# Altium footprint library Relay.PcbLib: 60 footprints (part 1 of 4)
Each footprint in its own frame and in the unit in brackets; x right, y up, seen from the top. Pads: shape width x height; smd on the part's side, far side on the other; paste and mask are expansions set on the pad; w line width, h text height; cw(c..) or ccw(c..) is an arc to the next point about the centre after c.
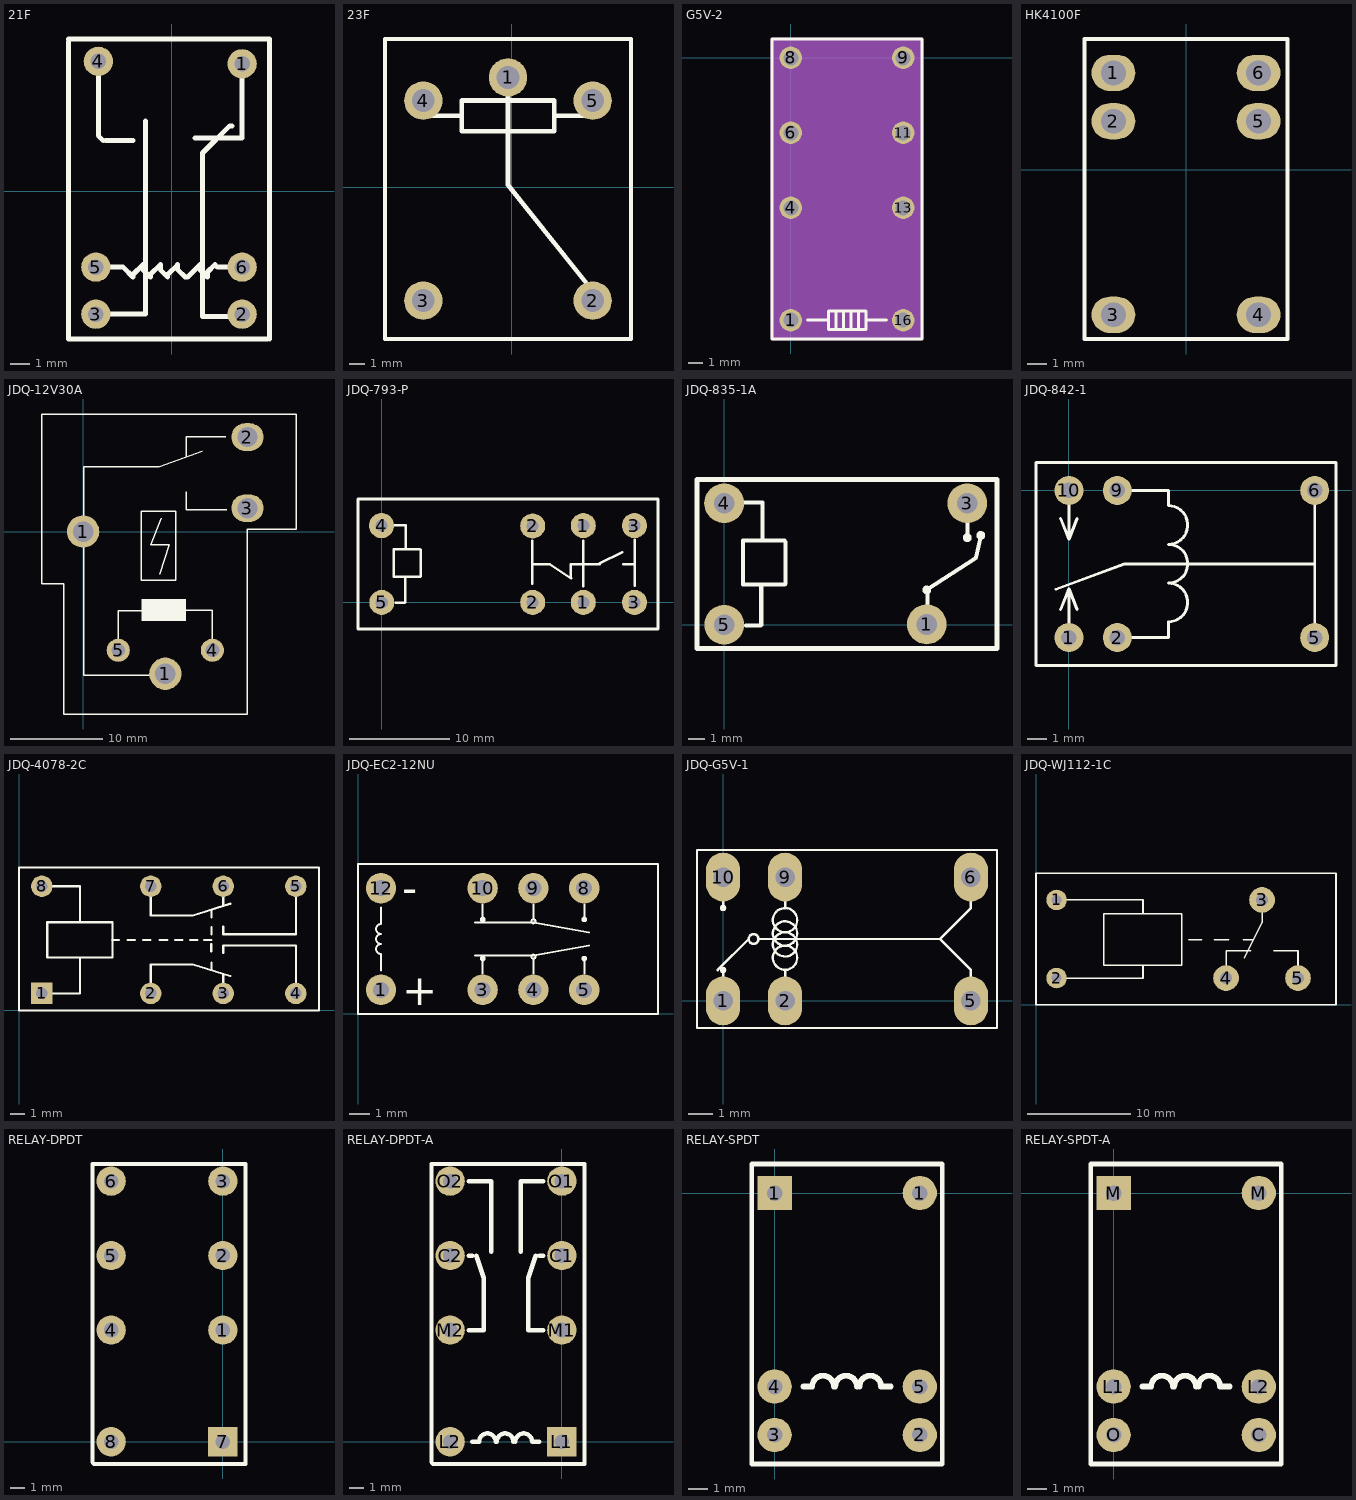
[diagram p0: the footprints below, top view; thin cyan lines are the x and y axes]

## 21F [mm]
pads (6):
  round 1.5 hole 0.8: 1(3.61,6.526) 2(3.61,-6.301) 3(-3.883,-6.301) 4(-3.756,6.653) 5(-3.883,-3.888) 6(3.61,-3.888)
Top Overlay:
  lines w0.254: -5.28,7.669 -5.28,-7.317 -5.28,-7.571 -5.026,-7.571 ; -5.28,7.796 5.007,7.796 5.007,-7.571 ; -5.153,-7.571 4.88,-7.571 ; -3.883,-6.301 -1.343,-6.301 -1.343,3.605 ; -3.883,-3.888 -2.486,-3.888 -1.978,-4.396 -1.978,-4.269 -1.47,-3.761 -1.47,-4.015 -1.089,-4.396 -1.089,-4.269 -0.581,-3.761 -0.581,-4.015 -0.2,-4.396 -0.2,-4.269 0.308,-3.761 0.308,-4.015 0.689,-4.396 0.816,-4.396 1.451,-3.761 1.451,-4.015 1.832,-4.396 1.832,-4.142 2.213,-3.761 2.34,-3.888 3.356,-3.888 ; -3.756,6.653 -3.756,2.843 -3.502,2.589 ; -3.375,2.589 -1.978,2.589 ; 1.197,2.716 3.61,2.716 3.61,6.526 ; 3.102,3.351 2.975,3.351 1.578,1.954 1.578,1.192 1.578,-6.428 3.737,-6.428

## 23F [mil]
pads (5):
  round 100 hole 59.06: 1(-10,285) 2(210,-295) 3(-230,-295) 4(-230,225) 5(210,225)
Top Overlay:
  lines w10: -330,-395 310,-395 310,385 -330,385 -330,-395
  lines w12: -250,185 -130,185 ; -230,185 -230,225 ; -10,285 -10,5 230,-295 ; 110,185 230,185 ; 210,185 210,225 ; -130,145 110,145 110,225 -130,225 -130,145

## G5V-2 [mil]
pads (8):
  round 60 hole 40: 1(0,-700) 4(0,-400) 6(0,-200) 8(0,0) 9(300,0) 11(300,-200) 13(300,-400) 16(300,-700)
Top Overlay:
  lines w8: 45,-700 100,-700 ; 120,-725 120,-675 ; 140,-725 140,-675 ; 160,-725 160,-675 ; 180,-725 180,-675 ; 200,-700 255,-700 ; -50,-750 -50,50 350,50 350,-750 -50,-750 ; 100,-725 100,-675 200,-675 200,-725 100,-725
Mechanical 6:
  text "13" at 260,-450 h25
  text "11" at 260,-250 h25
  text "6" at -20,-250 h25
  text "9" at 280,-50 h25
  text "16" at 260,-750 h25
  text "8" at -20,-50 h25
  text "1" at -20,-750 h25
  text "4" at -20,-450 h25
Mechanical 7:
  lines w8: 45,-700 100,-700 ; 120,-725 120,-675 ; 140,-725 140,-675 ; 160,-725 160,-675 ; 180,-725 180,-675 ; 200,-700 255,-700 ; -50,-750 -50,50 350,50 350,-750 -50,-750 ; 100,-725 100,-675 200,-675 200,-725 100,-725
  text ".Designator" at -60,-680 h25
Mechanical 8:
  region: 350,-750 350,50 -50,50 -50,-750

## HK4100F [mm] "继?"
height 11.8
pads (6):
  oval 2.3x1.9 hole 1.3: 1(-3.81,5.08) 2(-3.81,2.54) 3(-3.81,-7.62) 4(3.81,-7.62) 5(3.81,2.54) 6(3.81,5.08)
Top Overlay:
  lines w0.2: -5.334,-8.89 5.334,-8.89 5.334,6.858 -5.334,6.858 -5.334,-8.89
3D body: height 12, standoff 0, extent -5.334,-8.89 5.334,6.858

## JDQ-12V30A [mm]
pads (6):
  round 3.5 hole 2.2: 1(0,0) 1(8.9,-15.4)
  oval 3.5x3 hole 2.2: 2(17.8,10.24) 3(17.8,2.54)
  round 2.5 hole 1.5: 4(14,-12.86) 5(3.8,-12.86)
Top Overlay:
  region: 11.147,-9.677 11.147,-7.315 6.296,-7.315 6.296,-9.677
  lines w0.15: 3.779,-12.979 3.779,-8.585 6.903,-8.585 ; 8.275,-4.623 9.342,-1.448 7.335,-1.448 8.453,1.473 ; 8.935,-15.545 0.045,-15.545 0.045,7.036 8.224,7.036 12.923,8.687 ; 10.282,-8.509 13.965,-8.509 13.965,-12.522 ; 11.145,4.318 11.145,2.388 15.565,2.388 ; 11.145,8.153 11.145,10.287 15.463,10.287 ; -4.5,-5.66 -4.5,12.74 23.1,12.74 23.1,0.24 17.8,0.24 17.8,-19.76 -2.1,-19.76 -2.1,-5.66 -4.499,-5.66 ; 6.294,-5.258 6.294,2.184 10.053,2.184 10.053,-5.258 6.294,-5.258
3D body "User Library-RELAY-RT1-24-30-A.step": height 20.2, standoff -2.8, extent -4.2,-19.51 22.8,12.49

## JDQ-793-P [mil]
pads (8):
  round 98 hole 47.24: 1(788,0) 1(788,300) 2(590,0) 2(590,299) 3(988,0) 3(988,300) 5(0,0)
  round 98.43 hole 47.24: 4(-0.98,300)
Top Overlay:
  lines w10: 43.31,302.17 94.49,302.17 94.49,210.63 ; 54.13,-1.97 89.57,-1.97 ; 91.54,0 91.54,99.41 ; 588.58,72.83 588.58,240.16 ; 588.58,149.61 653.54,149.61 ; 657.48,149.61 653.54,149.61 ; 738.19,95.47 738.19,149.61 786.42,149.61 ; 740.16,93.5 654.53,149.61 653.54,149.61 ; 788.39,62.99 788.39,241.14 ; 788.39,149.61 852.36,149.61 852.36,152.56 940.95,195.87 ; 944.88,149.61 989.17,149.61 ; 989.17,64.96 989.17,244.09 ; 46.26,99.41 149.61,99.41 151.57,101.38 151.57,204.72 148.62,207.68 46.26,207.68 46.26,99.41
  lines w12: -93,-104 1080,-104 1080,404 -93,404 -93,-104
3D body "User Library-LM1H.step": height 822.83, standoff -157.09, extent -87.21,-96.06 1074.21,396.06

## JDQ-835-1A [mil]
pads (4):
  round 98 hole 51.18: 1(500,1) 3(600,300) 5(0,0)
  round 98.43 hole 51.18: 4(0,300)
Top Overlay:
  circle w5.91: c500,85.93 r7.87
  circle w5.91: c600,215.07 r7.87
  circle w5.91: c633.25,220.4 r7.87
  lines w10: 43.31,302.17 94.49,302.17 94.49,210.63 ; 54.13,-1.97 89.57,-1.97 ; 91.54,0 91.54,99.41 ; 500,85.93 621.88,165.78 633.25,220.4 ; 501.57,1 501.57,85.93 ; 600,215.07 600,300 ; 46.26,99.41 149.61,99.41 151.57,101.38 151.57,204.72 148.62,207.68 46.26,207.68 46.26,99.41
  lines w12: -66.93,-58.66 673.23,-58.66 673.23,358.66 -66.93,358.66 -66.93,-58.66
3D body "User Library-TRC.step": height 590.55, standoff -137.8, extent -55.12,-50.98 661.42,350.98

## JDQ-842-1 [mm]
pads (6):
  round 1.5 hole 0.8 unplated: 1(0,-7.6)
  round 1.5 hole 0.8: 2(2.5,-7.6) 5(12.7,-7.6) 6(12.7,0) 9(2.5,0) 10(0,0)
Top Overlay:
  lines w0.15: -0.663,-5.103 2.853,-3.8 12.7,-3.8 ; -0.424,-6.145 0,-5.078 ; -0.424,-1.455 0,-2.522 ; 0,-7.6 0,-5.078 ; 0,0 0,-2.522 ; 0.424,-6.145 0,-5.078 ; 0.424,-1.455 0,-2.522 ; 2.5,-7.6 5.139,-7.6 5.139,-6.785 ccw(c5.139,-5.785) 5.139,-4.785 ccw(c5.139,-3.785) 5.139,-2.785 ccw(c5.139,-1.785) 5.139,-0.785 5.139,0 2.5,0 ; 12.7,-7.6 12.7,0 ; -1.7,-9.05 13.8,-9.05 13.8,1.45 -1.7,1.45 -1.7,-9.05
3D body "User Library-TRB.step": height 11.81, standoff -3.5, extent -1.7,-9.15 13.8,1.55

## JDQ-4078-2C [mm]
pads (8):
  rect 1.5x1.5 hole 0.8: 1(1.6,1.19)
  round 1.5 hole 0.8: 2(9.22,1.19) 3(14.3,1.19) 4(19.38,1.19) 5(19.38,8.69) 6(14.3,8.69) 7(9.22,8.69) 8(1.6,8.69)
Top Overlay:
  lines w0.15: 1.6,1.19 4.267,1.19 4.267,3.708 ; 1.6,8.69 4.267,8.69 4.267,6.172 ; 6.528,4.928 7,4.928 ; 7.595,4.928 8.121,4.928 ; 8.687,4.928 9.213,4.928 ; 9.22,1.19 9.22,3.226 12.192,3.226 14.783,2.413 ; 9.22,8.69 9.22,6.654 12.192,6.654 14.783,7.467 ; 9.855,4.928 10.382,4.928 ; 10.922,4.928 11.448,4.928 ; 11.963,4.928 12.49,4.928 ; 12.954,4.928 13.48,4.928 ; 13.462,4.122 13.462,4.648 ; 13.487,2.819 13.487,3.346 ; 13.487,5.316 13.487,5.842 ; 13.487,6.509 13.487,7.036 ; 14.3,1.19 14.3,2.515 ; 14.3,4.013 14.3,4.547 19.38,4.547 19.38,1.19 ; 14.3,5.867 14.3,5.333 19.38,5.333 19.38,8.69 ; 14.3,7.365 14.3,8.69 ; 0,0 0,10 21,10 21,0 0,0 ; 1.981,3.708 6.553,3.708 6.553,6.172 1.981,6.172 1.981,3.708
3D body "User Library-DSY2Y.step": height 3, standoff -12.3, extent 0.1,0.1 20.9,9.9

## JDQ-EC2-12NU [mm]
pads (8):
  round 1.524 hole 0.8: 1(1.15,1.21) 3(6.23,1.21) 4(8.77,1.21) 5(11.31,1.21) 8(11.31,6.29) 9(8.77,6.29) 10(6.23,6.29) 12(1.15,6.29)
Top Overlay:
  circle w0.1: c6.234,4.73 r0.09
  circle w0.1: c8.772,4.637 r0.1
  circle w0.1: c11.314,4.73 r0.09
  circle w0.1: c11.314,2.77 r0.09
  circle w0.1: c8.772,2.863 r0.1
  circle w0.1: c6.234,2.77 r0.09
  lines w0.1: 1.15,2.163 1.15,3 cw(c1.15,3.25) 1.15,3.5 cw(c1.15,3.75) 1.15,4 cw(c1.15,4.25) 1.15,4.5 1.15,5.338 ; 5.844,2.926 8.77,2.926 11.559,3.426 ; 5.844,4.574 8.77,4.574 11.559,4.074 ; 6.234,2.025 6.234,2.77 ; 6.234,4.73 6.234,5.475 ; 8.772,2.026 8.772,2.761 ; 8.772,4.739 8.772,5.474 ; 11.314,2.025 11.314,2.77 ; 11.314,4.73 11.314,5.475 ; 0,0 15,0 15,7.5 0,7.5 0,0
  text "-" at 2.211,5.528 h1.52
  text "+" at 2.211,0.448 h1.52
3D body "User Library-TX2-5V.STEP": height 8.2, standoff -3.5, extent 0,0.049 15,7.449

## JDQ-G5V-1 [mm]
pads (6):
  oval 1.4x2 hole 0.8: 1(0,0) 2(2.54,0) 5(10.16,0) 6(10.16,5.08) 9(2.54,5.08) 10(0,5.08)
Top Overlay:
  circle w0.1: c1.247,2.54 r0.2
  circle w0.1: c0,1.27 r0.08
  circle w0.1: c0,3.81 r0.08
  circle w0.1: c2.54,3.312 r0.498
  circle w0.1: c2.54,2.319 r0.498
  circle w0.1: c2.54,1.774 r0.498
  circle w0.1: c2.54,2.768 r0.498
  lines w0.1: -0.224,1.264 1.052,2.54 ; 0,0.797 0,1.27 ; 0,3.81 0,4.267 ; 1.447,2.54 8.89,2.54 ; 2.54,0.802 2.54,1.27 ; 2.54,3.81 2.54,4.282 ; 10.16,0.793 10.16,1.27 8.89,2.54 ; 10.16,4.275 10.16,3.81 8.89,2.54 ; -1.07,-1.11 11.23,-1.11 11.23,6.19 -1.07,6.19 -1.07,-1.11
3D body "User Library-G5V-1.step": height 10, standoff -3, extent -1.17,-1.21 11.33,6.29

## JDQ-WJ112-1C [mm]
pads (5):
  round 2 hole 1: 1(2,10.2) 2(2,2.6)
  round 2.5 hole 1.2: 3(22,10.2) 4(18.5,2.6) 5(25.5,2.6)
Top Overlay:
  lines w0.15: 2,2.6 10.414,2.6 10.414,3.861 ; 2,10.2 10.414,10.2 10.414,8.839 ; 14.859,6.325 16.129,6.325 ; 17.374,6.325 18.745,6.325 ; 18.5,2.6 18.5,5.258 20.879,5.258 ; 20.168,6.325 21.082,6.325 ; 20.27,4.571 22,8 22,10.2 ; 23.121,5.258 25.5,5.258 25.5,2.6 ; 0,0 0,12.8 29.2,12.8 29.2,0 0,0 ; 6.579,3.861 6.579,8.839 14.199,8.839 14.199,3.861 6.579,3.861
3D body "User Library-RelayLM1-12D_H25_5mm.STEP": height 25.96, standoff -4.04, extent -0.1,0.1 29.3,12.7

## RELAY-DPDT [mm]
pads (8):
  round 2 hole 1: 1(0,7.62) 2(0,12.7) 3(0,17.78) 4(-7.62,7.62) 5(-7.62,12.7) 6(-7.62,17.78) 8(-7.62,0)
  rect 2x2 hole 1: 7(0,0)
Top Overlay:
  lines w0.3: -8.894,-1.414 -8.894,18.948 1.52,18.948 1.55,18.918 1.55,18.41 1.55,-1.52 -8.45,-1.52 -8.788,-1.52

## RELAY-DPDT-A [mm]
pads (8):
  round 2 hole 1: C1(0,12.7) C2(-7.62,12.7) L2(-7.62,0) M1(0,7.62) M2(-7.62,7.62) O1(0,17.78) O2(-7.62,17.78)
  rect 2x2 hole 1: L1(0,0)
Top Overlay:
  lines w0.3: -8.894,-1.414 -8.894,18.948 1.52,18.948 1.55,18.918 1.55,18.41 1.55,-1.52 -8.45,-1.52 -8.788,-1.52
  lines w0.305: -6.35,7.62 -5.334,7.62 -5.334,11.176 -5.842,12.7 ; -6.35,12.7 -6.096,12.7 ; -6.35,17.78 -4.826,17.78 -4.826,12.954 ; -6.096,0 -5.648,0 cw(c-5.08,0) -4.512,0 ; -4.438,0 cw(c-3.87,0) -3.302,0 ; -3.168,0 cw(c-2.6,0) -2.032,0 -1.524,0 ; -2.794,12.954 -2.794,17.78 -1.27,17.78 ; -1.778,12.7 -2.286,11.176 -2.286,7.62 -1.27,7.62 ; -1.524,12.7 -1.27,12.7

## RELAY-SPDT [mm]
pads (6):
  rect 1.8x1.8 hole 0.813: 1(0,0)
  round 1.8 hole 0.813: 1(7.62,0) 2(7.62,-12.7) 3(0,-12.7) 4(0,-10.16) 5(7.62,-10.16)
Top Overlay:
  lines w0.254: -1.2,-14.224 8.8,-14.224 8.8,1.524 -1.2,1.524 -1.2,-14.224
  lines w0.305: 1.524,-10.16 1.972,-10.16 cw(c2.54,-10.16) 3.108,-10.16 ; 3.182,-10.16 cw(c3.75,-10.16) 4.318,-10.16 ; 4.452,-10.16 cw(c5.02,-10.16) 5.588,-10.16 6.096,-10.16

## RELAY-SPDT-A [mm]
pads (6):
  round 1.8 hole 0.813: C(7.62,-12.7) L1(0,-10.16) L2(7.62,-10.16) M(7.62,0) O(0,-12.7)
  rect 1.8x1.8 hole 0.813: M(0,0)
Top Overlay:
  lines w0.254: -1.2,-14.224 -1.2,1.524 8.8,1.524 8.8,-14.224 -1.2,-14.224
  lines w0.305: 1.524,-10.16 1.972,-10.16 cw(c2.54,-10.16) 3.108,-10.16 ; 3.182,-10.16 cw(c3.75,-10.16) 4.318,-10.16 ; 4.452,-10.16 cw(c5.02,-10.16) 5.588,-10.16 6.096,-10.16